# Altium integrated library Res-THP_V2.IntLib: 460 symbols (part 3 of 3)
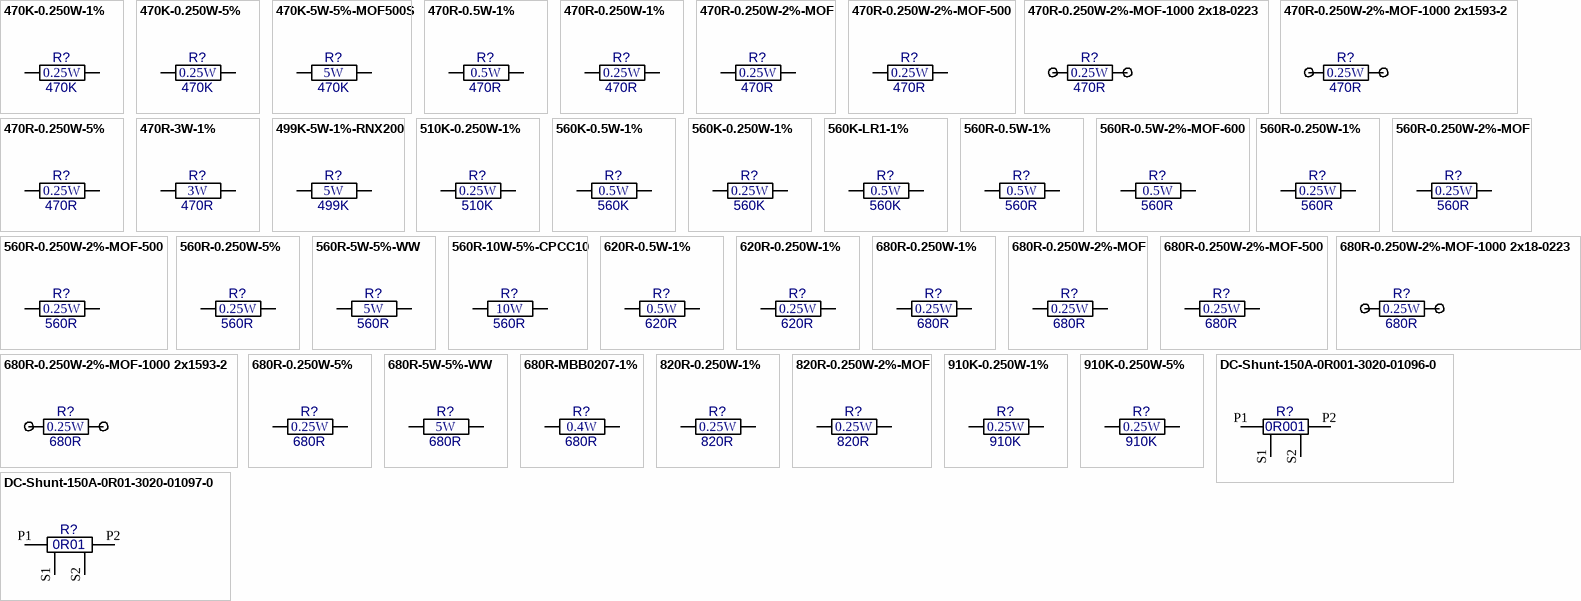
[diagram p13: symbols 470K-0.250W-1% to DC-Shunt-150A-0R01-3020-01097-0]

## 560R-0.250W-2%-MOF-500
designator R?, comment value 560R  Watt: 0.25W  (hidden comment: 560R-0.250W-2%)
Resistor Metal Oxide Film; Manufacturer: Various; Part Number: 560R 2% 0.25W MOF; Tol: 2%; Package: RES-0.250W-500; EDM-PN: *; Text2: *; Text1: *
footprint RES-0.250W-500 (Res 0.25W 7.6x2.3mm)
pins: 1, 2

## 560R-0.250W-5%
designator R?, comment value 560R  Watt: 0.25W  (hidden comment: 560R-0.250W-5%_H)
Resistor Carbon; Manufacturer: Various; Part Number: 560R 5% 0.25W; Tol: 5%; Package: RES-0.250W; EDM-PN: *; Text2: *; Text1: *
footprint RES-0.250W (Res 0.25W 7.6x2.3mm)
pins: 1, 2

## 560R-5W-5%-WW
designator R?  value 560R  Watt: 5W  (hidden comment: 560R-5W-5%-WW)
Resistor Wirewound; Manufacturer: Various; Part Number: 560R 5% 5W WW; Tol: 5%; Package: RES-5W-WW; EDM-PN: *; Text2: *; Text1: *
footprint Res-5W-WW (Res 5W WW 17.0x7.5mm)
pins: 1, 2

## 560R-10W-5%-CPCC10
designator R?, comment value 560R  Watt: 10W  (hidden comment: CPCC10560R0JE32)
Resistor Wirewound Radial Flame Proof Safety; Manufacturer: Vishay; Tol: 5%; Reutech PN: 5905-WW-0139; Part Number: CPCC10560R0JE32; Package: RES-CPCC10; EDM-PN: *; Text2: *; Text1: *
footprint RES-CPCC10 (Res CPCC10 16.08x12.32mm)
pins: 1, 2

## 620R-0.5W-1%
designator R?  value 620R  Watt: 0.5W  (hidden comment: 620R-0.5W-1%)
Resistor Metal Film; Manufacturer: Various; Part Number: 620R 1% 0.5W; Tol: 1%; Package: RES-0.5W; EDM-PN: *; Text2: *; Text1: *
footprint RES-0.5W (RES-0.5W 10.0x3.8mm)
pins: 1, 2

## 620R-0.250W-1%
designator R?  value 620R  Watt: 0.25W  (hidden comment: 620R-0.250W-1%)
Resistor Metal Film; Manufacturer: Various; Part Number: 620R 1% 0.25W; Tol: 1%; Package: RES-0.250W; EDM-PN: *; Text2: *; Text1: *
footprint RES-0.250W (Res 0.25W 7.6x2.3mm)
pins: 1, 2

## 680R-0.250W-1%
designator R?, comment value 680R  Watt: 0.25W  (hidden comment: 680R-0.250W-1%_H)
Resistor Metal Film; Manufacturer: Various; Part Number: 680R 1% 0.25W; Tol: 1%; Package: RES-0.250W; EDM-PN: *; Text2: *; Text1: *
footprint RES-0.250W (Res 0.25W 7.6x2.3mm)
pins: 1, 2

## 680R-0.250W-2%-MOF
designator R?, comment value 680R  Watt: 0.25W  (hidden comment: 680R-0.250W-2%)
Resistor Metal Oxide Film; Manufacturer: Various; Part Number: 680R 2% 0.25W MOF; Tol: 2%; Package: RES-0.250W; EDM-PN: *; Text2: *; Text1: *
footprint RES-0.250W (Res 0.25W 7.6x2.3mm)
pins: 1, 2

## 680R-0.250W-2%-MOF-500
designator R?, comment value 680R  Watt: 0.25W  (hidden comment: 680R-0.250W-2%)
Resistor Metal Oxide Film; Manufacturer: Various; Part Number: 680R 2% 0.25W MOF; Tol: 2%; Package: RES-0.250W-500; EDM-PN: *; Text2: *; Text1: *
footprint RES-0.250W-500 (Res 0.25W 7.6x2.3mm)
pins: 1, 2

## 680R-0.250W-2%-MOF-1000 2x18-0223
designator R?, comment value 680R  Watt: 0.25W  (hidden comment: 680R-0.250W-2% & 2x18-0223)
Resistor Metal Oxide Film and 2 Terminals; Manufacturer: Various & Vero; Part Number: 680R 2% 0.25W MOF & 2x18-0223; Tol: 2%; Package: RES-0.250W-1000-18-0223; EDM-PN: *; Text2: *; Text1: *
footprint RES-0.250W-1000-18-0223 (Res 0.25W 7.6x2.3mm)
pins: 1, 2

## 680R-0.250W-2%-MOF-1000 2x1593-2
designator R?, comment value 680R  Watt: 0.25W  (hidden comment: 680R-0.250W-2% & 2x1593-2)
Resistor Metal Oxide Film and 2 Terminals; Manufacturer: Various & Keystone; Part Number: 680R 2% 0.25W MOF & 2x1593-2; Tol: 2%; Package: RES-0.250W-1000-1593-2; EDM-PN: *; Text2: *; Text1: *
footprint RES-0.250W-1000-1593-2 (Res 0.25W 7.6x2.3mm)
pins: 1, 2

## 680R-0.250W-5%
designator R?, comment value 680R  Watt: 0.25W  (hidden comment: 680R-0.250W-5%_H)
Resistor Carbon; Manufacturer: Various; Part Number: 680R 5% 0.25W; Tol: 5%; Package: RES-0.250W; EDM-PN: *; Text2: *; Text1: *
footprint RES-0.250W (Res 0.25W 7.6x2.3mm)
pins: 1, 2

## 680R-5W-5%-WW
designator R?  value 680R  Watt: 5W  (hidden comment: 680R-5W-5%-WW)
Resistor Wirewound; Manufacturer: Various; Part Number: 680R 5% 5W WW; Tol: 5%; Package: RES-5W-WW; EDM-PN: *; Text2: *; Text1: *
footprint Res-5W-WW (Res 5W WW 17.0x7.5mm)
pins: 1, 2

## 680R-MBB0207-1%
designator R?, comment value 680R  Watt: 0.4W  (hidden comment: 680R-MBB0207-1%_H)
Resistor Metal Film; Manufacturer: Vishay; Part Number: 680R 1% MBB0207; Tol: 1%; Package: RES-MBB0207; EDM-PN: *; Text2: *; Text1: *; Reutech PN: 5905-99-0681
footprint RES-MBB0207 (MBB0207 6.3x2.5mm)
pins: 1, 2

## 820R-0.250W-1%
designator R?  value 820R  Watt: 0.25W  (hidden comment: 820R-0.250W-1%)
Resistor Metal Film; Manufacturer: Various; Part Number: 820R 1% 0.25W; Tol: 1%; Package: RES-0.250W; EDM-PN: *; Text2: *; Text1: *
footprint RES-0.250W (Res 0.25W 7.6x2.3mm)
pins: 1, 2

## 820R-0.250W-2%-MOF
designator R?, comment value 820R  Watt: 0.25W  (hidden comment: 820R-0.250W-2%)
Resistor Metal Oxide Film; Manufacturer: Various; Part Number: 820R 2% 0.25W MOF; Tol: 2%; Package: RES-0.250W; EDM-PN: *; Text2: *; Text1: *
footprint RES-0.250W (Res 0.25W 7.6x2.3mm)
pins: 1, 2

## 910K-0.250W-1%
designator R?, comment value 910K  Watt: 0.25W  (hidden comment: 910K-0.250W-1%_H)
Resistor Metal Film; Manufacturer: Various; Part Number: 910K 1% 0.25W; Tol: 1%; Package: RES-0.250W; EDM-PN: *; Text2: *; Text1: *
footprint RES-0.250W (Res 0.25W 7.6x2.3mm)
pins: 1, 2

## 910K-0.250W-5%
designator R?, comment value 910K  Watt: 0.25W  (hidden comment: 910K-0.250W-5%_H)
Resistor Carbon; Manufacturer: Various; Part Number: 910K 5% 0.25W; Tol: 5%; Package: RES-0.250W; EDM-PN: *; Text2: *; Text1: *
footprint RES-0.250W (Res 0.25W 7.6x2.3mm)
pins: 1, 2

## DC-Shunt-150A-0R001-3020-01096-0
designator R?, comment value 0R001  (hidden comment: 3020-01096-0)
DC Shunt Base Mount 50A/50mV; Manufacturer: Murata Power; Part Number: 3020-01096-0; Package: DC-Shunt-150A; EDM-PN: *; Text2: *; Tol: *; Watt: *; Text1: *
footprint DC-Shunt-150A (C-Shunt-150A 50.8x31.7mm)
pins: P1, P2, S1, S2

## DC-Shunt-150A-0R01-3020-01097-0
designator R?, comment value 0R01  (hidden comment: 3020-01097-0)
DC Shunt Base Mount 5A/50mV; Manufacturer: Murata Power; Part Number: 3020-01097-0; Package: DC-Shunt-150A; EDM-PN: *; Text2: *; Tol: *; Watt: *; Text1: *
footprint DC-Shunt-150A (C-Shunt-150A 50.8x31.7mm)
pins: P1, P2, S1, S2

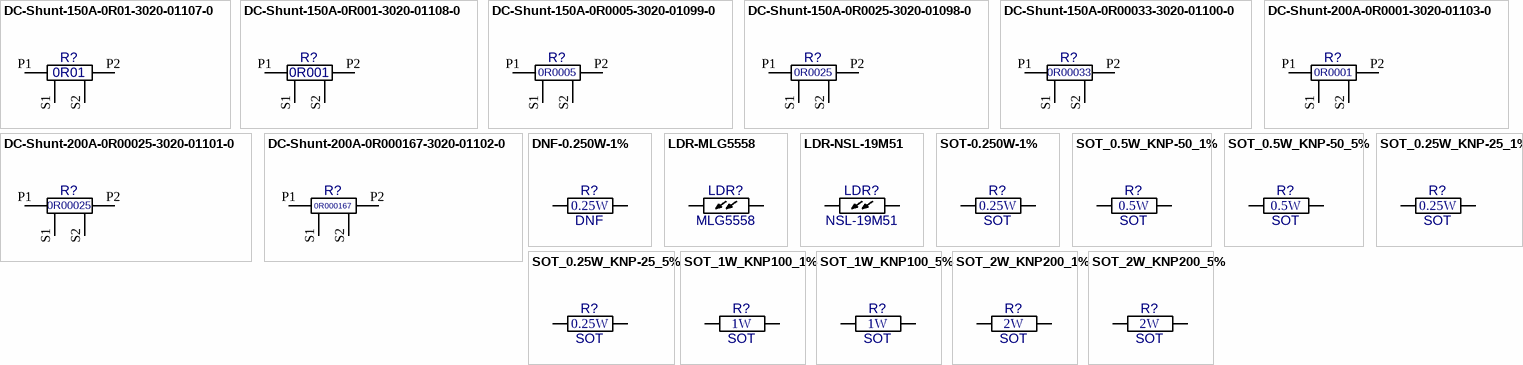
[diagram p11: symbols DC-Shunt-150A-0R01-3020-01107-0 to SOT_2W_KNP200_5%]

## DC-Shunt-150A-0R01-3020-01107-0
designator R?, comment value 0R01  (hidden comment: 3020-01107-0)
DC Shunt Base Mount 10A/100mV; Manufacturer: Murata Power; Part Number: 3020-01107-0; Package: DC-Shunt-150A; EDM-PN: *; Text2: *; Tol: *; Watt: *; Text1: *
footprint DC-Shunt-150A (C-Shunt-150A 50.8x31.7mm)
pins: P1, P2, S1, S2

## DC-Shunt-150A-0R001-3020-01108-0
designator R?, comment value 0R001  (hidden comment: 3020-01108-0)
DC Shunt Base Mount 100A/100mV; Manufacturer: Murata Power; Part Number: 3020-01108-0; Package: DC-Shunt-150A; EDM-PN: *; Text2: *; Tol: *; Watt: *; Text1: *
footprint DC-Shunt-150A (C-Shunt-150A 50.8x31.7mm)
pins: P1, P2, S1, S2

## DC-Shunt-150A-0R0005-3020-01099-0
designator R?, comment value 0R0005  (hidden comment: 3020-01099-0)
DC Shunt Base Mount 100A/50mV; Manufacturer: Murata Power; Part Number: 3020-01098-0; Package: DC-Shunt-150A; EDM-PN: *; Text2: *; Tol: *; Watt: *; Text1: *
footprint DC-Shunt-150A (C-Shunt-150A 50.8x31.7mm)
pins: P1, P2, S1, S2

## DC-Shunt-150A-0R0025-3020-01098-0
designator R?, comment value 0R0025  (hidden comment: 3020-01098-0)
DC Shunt Base Mount 20A/50mV; Manufacturer: Murata Power; Part Number: 3020-01098-0; Package: DC-Shunt-150A; EDM-PN: *; Text2: *; Tol: *; Watt: *; Text1: *
footprint DC-Shunt-150A (C-Shunt-150A 50.8x31.7mm)
pins: P1, P2, S1, S2

## DC-Shunt-150A-0R00033-3020-01100-0
designator R?, comment value 0R00033  (hidden comment: 3020-01100-0)
DC Shunt Base Mount 150A/50mV; Manufacturer: Murata Power; Part Number: 3020-01100-0; Package: DC-Shunt-150A; EDM-PN: *; Text2: *; Tol: *; Watt: *; Text1: *
footprint DC-Shunt-150A (C-Shunt-150A 50.8x31.7mm)
pins: P1, P2, S1, S2

## DC-Shunt-200A-0R0001-3020-01103-0
designator R?, comment value 0R0001  (hidden comment: 3020-01103-0)
DC Shunt Base Mount 500A/50mV; Manufacturer: Murata Power; Part Number: 3020-01103-0; Package: DC-Shunt-200A; EDM-PN: *; Text2: *; Tol: *; Watt: *; Text1: *
footprint DC-Shunt-200A (C-Shunt-200A 82.5x44.4mm)
pins: P1, P2, S1, S2

## DC-Shunt-200A-0R00025-3020-01101-0
designator R?, comment value 0R00025  (hidden comment: 3020-01101-0)
DC Shunt Base Mount 200A/50mV; Manufacturer: Murata Power; Part Number: 3020-01101-0; Package: DC-Shunt-200A; EDM-PN: *; Text2: *; Tol: *; Watt: *; Text1: *
footprint DC-Shunt-200A (C-Shunt-200A 82.5x44.4mm)
pins: P1, P2, S1, S2

## DC-Shunt-200A-0R000167-3020-01102-0
designator R?, comment value 0R000167  (hidden comment: 3020-01102-0)
DC Shunt Base Mount 300A/50mV; Manufacturer: Murata Power; Part Number: 3020-01102-0; Package: DC-Shunt-200A; EDM-PN: *; Text2: *; Tol: *; Watt: *; Text1: *
footprint DC-Shunt-200A (C-Shunt-200A 82.5x44.4mm)
pins: P1, P2, S1, S2

## DNF-0.250W-1%
designator R?, comment value DNF  Watt: 0.25W  (hidden comment: DNF-0.250W-1%_H)
Resistor Metal Film (Do not Fit); Manufacturer: Various; Tol: 1%; Part Number: DNF; Package: RES-0.250W; EDM-PN: *; Text2: *; Text1: *
footprint RES-0.250W (Res 0.25W 7.6x2.3mm)
pins: 1, 2

## LDR-MLG5558
designator LDR?, comment value MLG5558  (hidden comment: LDR-MLG5558_H)
Resistor Photoconductive Cell; Manufacturer: MEC; Watt: 100mW; Part Number: MLG5558; Package: LDR-5mm; EDM-PN: *; Text2: *; Tol: *; Text1: *
footprint LDR-5mm (LDR-5mm 5.1x4.3mm)
pins: 1, 2

## LDR-NSL-19M51
designator LDR?, comment NSL-19M51
Resistor Photoconductive Cell 550nm; Manufacturer: Advanced Photonix; Part Number: NSL-19M51; Package: LDR-4.1x3.4-1.8MM; EDM-PN: *; Text2: *; Tol: *; Text1: *; Watt: *; Value: NSL-19M51
footprint LDR-4.1x3.4-1.8MM (LDR 4.1x3.4mm)
pins: 1, 2

## SOT-0.250W-1%
designator R?, comment value SOT  Watt: 0.25W  (hidden comment: SOT-0.250W-1%_H)
Resistor Metal Film; Manufacturer: Various; Tol: 1%; Part Number: SOT; Package: RES-0.250W; EDM-PN: *; Text2: *; Text1: *
footprint RES-0.250W (Res 0.25W 7.6x2.3mm)
pins: 1, 2

## SOT_0.5W_KNP-50_1%
designator R?, comment value SOT  Watt: 0.5W  (hidden comment: SOT_0.5W_KNP-50_1%_H)
Resistor Wirewound; Manufacturer: Yageo; Part Number: KNP-50FB-SOT; Tol: 1%; Package: RES-KNP-50; EDM-PN: *; Text2: *; Text1: *
footprint RES-KNP-50 (KNP-50 10.0x3.8mm)
pins: 1, 2

## SOT_0.5W_KNP-50_5%
designator R?, comment value SOT  Watt: 0.5W  (hidden comment: SOT_0.5W_KNP-50_5%_H)
Resistor Wirewound; Manufacturer: Yageo; Part Number: KNP-50JB-SOT; Tol: 5%; Package: RES-KNP-50; EDM-PN: *; Text2: *; Text1: *
footprint RES-KNP-50 (KNP-50 10.0x3.8mm)
pins: 1, 2

## SOT_0.25W_KNP-25_1%
designator R?, comment value SOT  Watt: 0.25W  (hidden comment: SOT_0.25W_KNP-25_1%_H)
Resistor Wirewound; Manufacturer: Yageo; Part Number: KNP-25FB-SOT; Tol: 1%; Package: RES-KNP-25; EDM-PN: *; Text2: *; Text1: *
footprint RES-KNP-25 (Res KNP-25 6.3x2.5mm)
pins: 1, 2

## SOT_0.25W_KNP-25_5%
designator R?, comment value SOT  Watt: 0.25W  (hidden comment: SOT_0.25W_KNP-25_5%_H)
Resistor Wirewound; Manufacturer: Yageo; Part Number: KNP-25JB-SOT; Tol: 5%; Package: RES-KNP-25; EDM-PN: *; Text2: *; Text1: *
footprint RES-KNP-25 (Res KNP-25 6.3x2.5mm)
pins: 1, 2

## SOT_1W_KNP100_1%
designator R?, comment value SOT  Watt: 1W  (hidden comment: SOT_1W_KNP100_1%_H)
Resistor Wirewound; Manufacturer: Yageo; Part Number: KNP100FR-52-SOT; Tol: 1%; Package: RES-KNP100; EDM-PN: *; Text2: *; Text1: *
footprint RES-KNP100 (RES 1W PMW 11.5x4.5mm)
pins: 1, 2

## SOT_1W_KNP100_5%
designator R?, comment value SOT  Watt: 1W  (hidden comment: SOT_1W_KNP100_5%_H)
Resistor Wirewound; Manufacturer: Yageo; Part Number: KNP100JR-52-SOT; Tol: 5%; Package: RES-KNP100; EDM-PN: *; Text2: *; Text1: *
footprint RES-KNP100 (RES 1W PMW 11.5x4.5mm)
pins: 1, 2

## SOT_2W_KNP200_1%
designator R?, comment value SOT  Watt: 2W  (hidden comment: SOT_2W_KNP200_1%_H)
Resistor Wirewound; Manufacturer: Yageo; Part Number: KNP200FB-SOT; Tol: 1%; Package: RES-KNP200; EDM-PN: *; Text2: *; Text1: *
footprint RES-KNP200 (Res KNP200 15.5x5.5mm)
pins: 1, 2

## SOT_2W_KNP200_5%
designator R?, comment value SOT  Watt: 2W  (hidden comment: SOT_2W_KNP200_5%_H)
Resistor Wirewound; Manufacturer: Yageo; Part Number: KNP200JB-SOT; Tol: 5%; Package: RES-KNP200; EDM-PN: *; Text2: *; Text1: *
footprint RES-KNP200 (Res KNP200 15.5x5.5mm)
pins: 1, 2